# Altium footprint library Connektor.PcbLib: 305 footprints (part 5 of 20)
Each footprint in its own frame and in the unit in brackets; x right, y up, seen from the top. Pads: shape width x height; smd on the part's side, far side on the other; paste and mask are expansions set on the pad; w line width, h text height; cw(c..) or ccw(c..) is an arc to the next point about the centre after c.
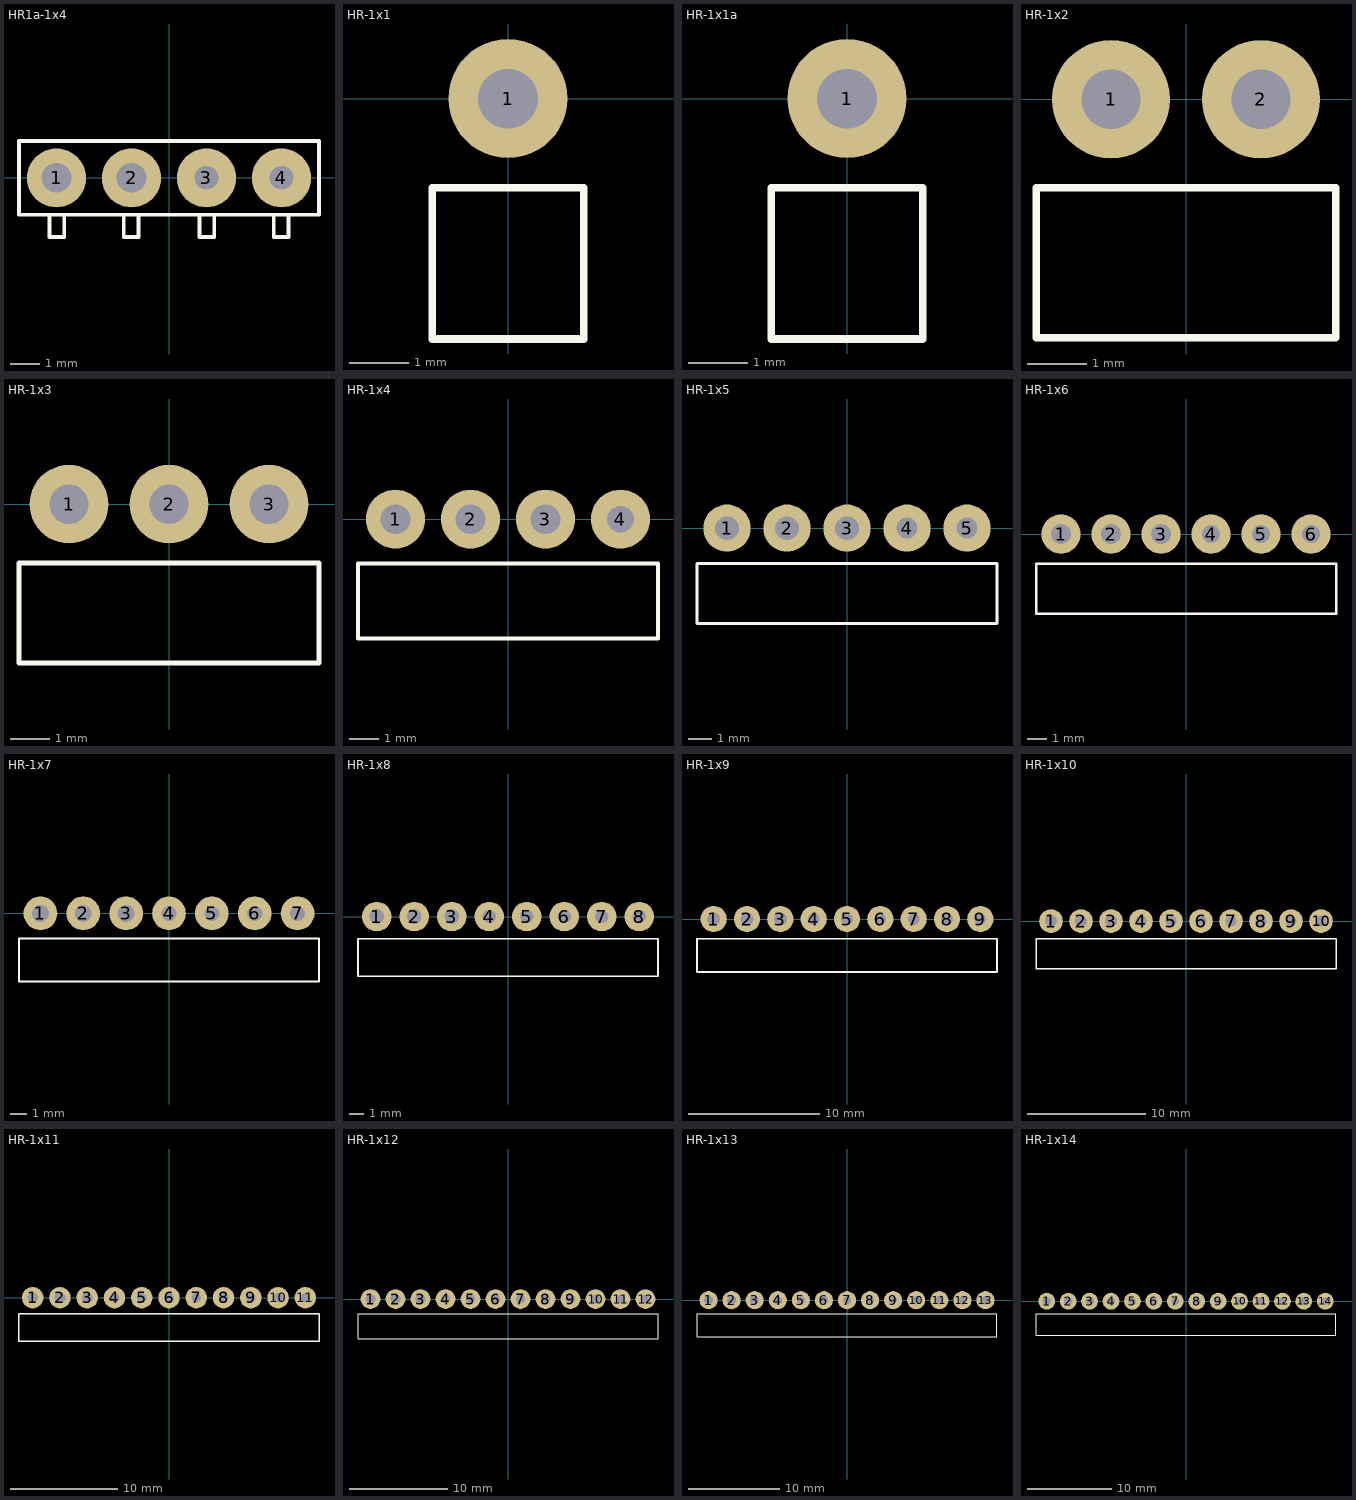
[diagram p4: the footprints below, top view; thin cyan lines are the x and y axes]

## HR1a-1x4 [mm]
pads (4):
  round 2 hole 1: 1(-3.81,0) 2(-1.27,0)
  round 2 hole 0.8: 3(1.27,0) 4(3.81,0)
TopOverlay:
  lines w0.127: -4.044,-1.25 -4.044,-2 -3.544,-2 -3.544,-1.25 ; -1.536,-1.25 -1.536,-2 -1.036,-2 -1.036,-1.25 ; 1.036,-1.25 1.036,-2 1.536,-2 1.536,-1.25 ; 3.544,-1.25 3.544,-2 4.044,-2 4.044,-1.25 ; -5.08,-1.25 -5.08,1.25 5.08,1.25 5.08,-1.25 -5.08,-1.25
3D body: height 5.41, standoff -2.5, extent -5.08,-7 5.08,1.27

## HR-1x1 [mm]
pads (1):
  round 2 hole 1: 1(0,0)
TopOverlay:
  lines w0.127: -1.27,-4.04 -1.27,-1.5 1.27,-1.5 1.27,-4.04 -1.27,-4.04
3D body: height 2.54, standoff -2, extent -1.27,-10 1.27,0.325

## HR-1x1a [mm]
pads (1):
  round 2 hole 1: 1(0,0)
TopOverlay:
  lines w0.127: -1.27,-4.04 1.27,-4.04 1.27,-1.5 -1.27,-1.5 -1.27,-4.04
3D body: height 2.54, standoff -2.5, extent -1.27,-6.5 1.27,0.325

## HR-1x2 [mm]
pads (2):
  round 2 hole 1: 1(-1.27,0) 2(1.27,0)
TopOverlay:
  lines w0.127: -2.54,-4.04 2.54,-4.04 2.54,-1.5 -2.54,-1.5 -2.54,-4.04
3D body: height 2.54, standoff -2, extent -2.54,-10 2.54,0.325

## HR-1x3 [mm]
pads (3):
  round 2 hole 1: 1(-2.54,0) 2(0,0) 3(2.54,0)
TopOverlay:
  lines w0.127: -3.81,-4.04 -3.81,-1.5 3.81,-1.5 3.81,-4.04 -3.81,-4.04
3D body: height 2.54, standoff -2, extent -3.81,-10 3.81,0.325

## HR-1x4 [mm]
pads (4):
  round 2 hole 1: 1(-3.81,0) 2(-1.27,0) 3(1.27,0)
  round 2 hole 0.9: 4(3.81,0)
TopOverlay:
  lines w0.127: -5.08,-4.04 5.08,-4.04 5.08,-1.5 -5.08,-1.5 -5.08,-4.04
3D body: height 2.54, standoff -2, extent -5.08,-10 5.08,0.325

## HR-1x5 [mm]
pads (5):
  round 2 hole 1: 1(-5.08,0) 2(-2.54,0) 3(0,0)
  round 2 hole 0.9: 4(2.54,0) 5(5.08,0)
TopOverlay:
  lines w0.127: -6.35,-4.04 -6.35,-1.5 6.35,-1.5 6.35,-4.04 -6.35,-4.04
3D body: height 2.54, standoff -3, extent -6.35,-10 6.35,0.325

## HR-1x6 [mm]
pads (6):
  round 2 hole 1: 1(-6.35,0) 2(-3.81,0) 3(-1.27,0)
  round 2 hole 0.9: 4(1.27,0) 5(3.81,0) 6(6.35,0)
TopOverlay:
  lines w0.127: -7.62,-4.04 -7.62,-1.5 7.62,-1.5 7.62,-4.04 -7.62,-4.04
3D body: height 2.54, standoff -3, extent -7.62,-10 7.62,0.325

## HR-1x7 [mm]
pads (7):
  round 2 hole 1: 1(-7.62,0) 2(-5.08,0) 3(-2.54,0)
  round 2 hole 0.9: 4(0,0) 5(2.54,0) 6(5.08,0) 7(7.62,0)
TopOverlay:
  lines w0.127: -8.89,-4.04 -8.89,-1.5 8.89,-1.5 8.89,-4.04 -8.89,-4.04
3D body: height 2.54, standoff -3, extent -8.89,-10 8.89,0.325

## HR-1x8 [mm]
pads (8):
  round 2 hole 1: 1(-8.89,0) 2(-6.35,0) 3(-3.81,0)
  round 2 hole 0.9: 4(-1.27,0) 5(1.27,0) 6(3.81,0) 7(6.35,0) 8(8.89,0)
TopOverlay:
  lines w0.127: -10.16,-4.04 -10.16,-1.5 10.16,-1.5 10.16,-4.04 -10.16,-4.04
3D body: height 2.54, standoff -2, extent -10.16,-10 10.16,0.325

## HR-1x9 [mm]
pads (9):
  round 2 hole 1: 1(-10.16,0) 2(-7.62,0) 3(-5.08,0)
  round 2 hole 0.9: 4(-2.54,0) 5(0,0) 6(2.54,0) 7(5.08,0) 8(7.62,0) 9(10.16,0)
TopOverlay:
  lines w0.127: -11.43,-4.04 11.43,-4.04 11.43,-1.5 -11.43,-1.5 -11.43,-4.04
3D body: height 2.54, standoff -2, extent -11.43,-10 11.43,0.325

## HR-1x10 [mm]
pads (10):
  round 2 hole 1: 1(-11.43,0) 2(-8.89,0) 3(-6.35,0)
  round 2 hole 0.9: 4(-3.81,0) 5(-1.27,0) 6(1.27,0) 7(3.81,0) 8(6.35,0) 9(8.89,0) 10(11.43,0)
TopOverlay:
  lines w0.127: -12.7,-4.04 -12.7,-1.5 12.7,-1.5 12.7,-4.04 -12.7,-4.04
3D body: height 2.54, standoff -2, extent -12.7,-10 12.7,0.325

## HR-1x11 [mm]
pads (11):
  round 2 hole 1: 1(-12.7,0) 2(-10.16,0) 3(-7.62,0)
  round 2 hole 0.9: 4(-5.08,0) 5(-2.54,0) 6(0,0) 7(2.54,0) 8(5.08,0) 9(7.62,0) 10(10.16,0) 11(12.7,0)
TopOverlay:
  lines w0.127: -13.97,-4.04 -13.97,-1.5 13.97,-1.5 13.97,-4.04 -13.97,-4.04
3D body: height 2.54, standoff -2, extent -13.97,-10 13.97,0.325

## HR-1x12 [mm]
pads (12):
  round 2 hole 1: 1(-13.97,0) 2(-11.43,0) 3(-8.89,0)
  round 2 hole 0.9: 4(-6.35,0) 5(-3.81,0) 6(-1.27,0) 7(1.27,0) 8(3.81,0) 9(6.35,0) 10(8.89,0) 11(11.43,0) 12(13.97,0)
TopOverlay:
  lines w0.127: -15.24,-4.04 15.24,-4.04 15.24,-1.5 -15.24,-1.5 -15.24,-4.04
3D body: height 2.54, standoff -2, extent -15.24,-10 15.24,0.325

## HR-1x13 [mm]
pads (13):
  round 2 hole 1: 1(-15.24,0) 2(-12.7,0) 3(-10.16,0)
  round 2 hole 0.9: 4(-7.62,0) 5(-5.08,0) 6(-2.54,0) 7(0,0) 8(2.54,0) 9(5.08,0) 10(7.62,0) 11(10.16,0) 12(12.7,0) 13(15.24,0)
TopOverlay:
  lines w0.127: -16.51,-4.04 -16.51,-1.5 16.51,-1.5 16.51,-4.04 -16.51,-4.04
3D body: height 2.54, standoff -2, extent -16.51,-10 16.51,0.325

## HR-1x14 [mm]
pads (14):
  round 2 hole 1: 1(-16.51,0) 2(-13.97,0) 3(-11.43,0)
  round 2 hole 0.9: 4(-8.89,0) 5(-6.35,0) 6(-3.81,0) 7(-1.27,0) 8(1.27,0) 9(3.81,0) 10(6.35,0) 11(8.89,0) 12(11.43,0) 13(13.97,0) 14(16.51,0)
TopOverlay:
  lines w0.127: -17.78,-4.04 -17.78,-1.5 17.78,-1.5 17.78,-4.04 -17.78,-4.04
3D body: height 2.54, standoff -2, extent -17.78,-10 17.78,0.325